# Altium footprint library CMR_ICs.PcbLib: 68 footprints (part 1 of 5)
Each footprint in its own frame and in the unit in brackets; x right, y up, seen from the top. Pads: shape width x height; smd on the part's side, far side on the other; paste and mask are expansions set on the pad; w line width, h text height; cw(c..) or ccw(c..) is an arc to the next point about the centre after c.
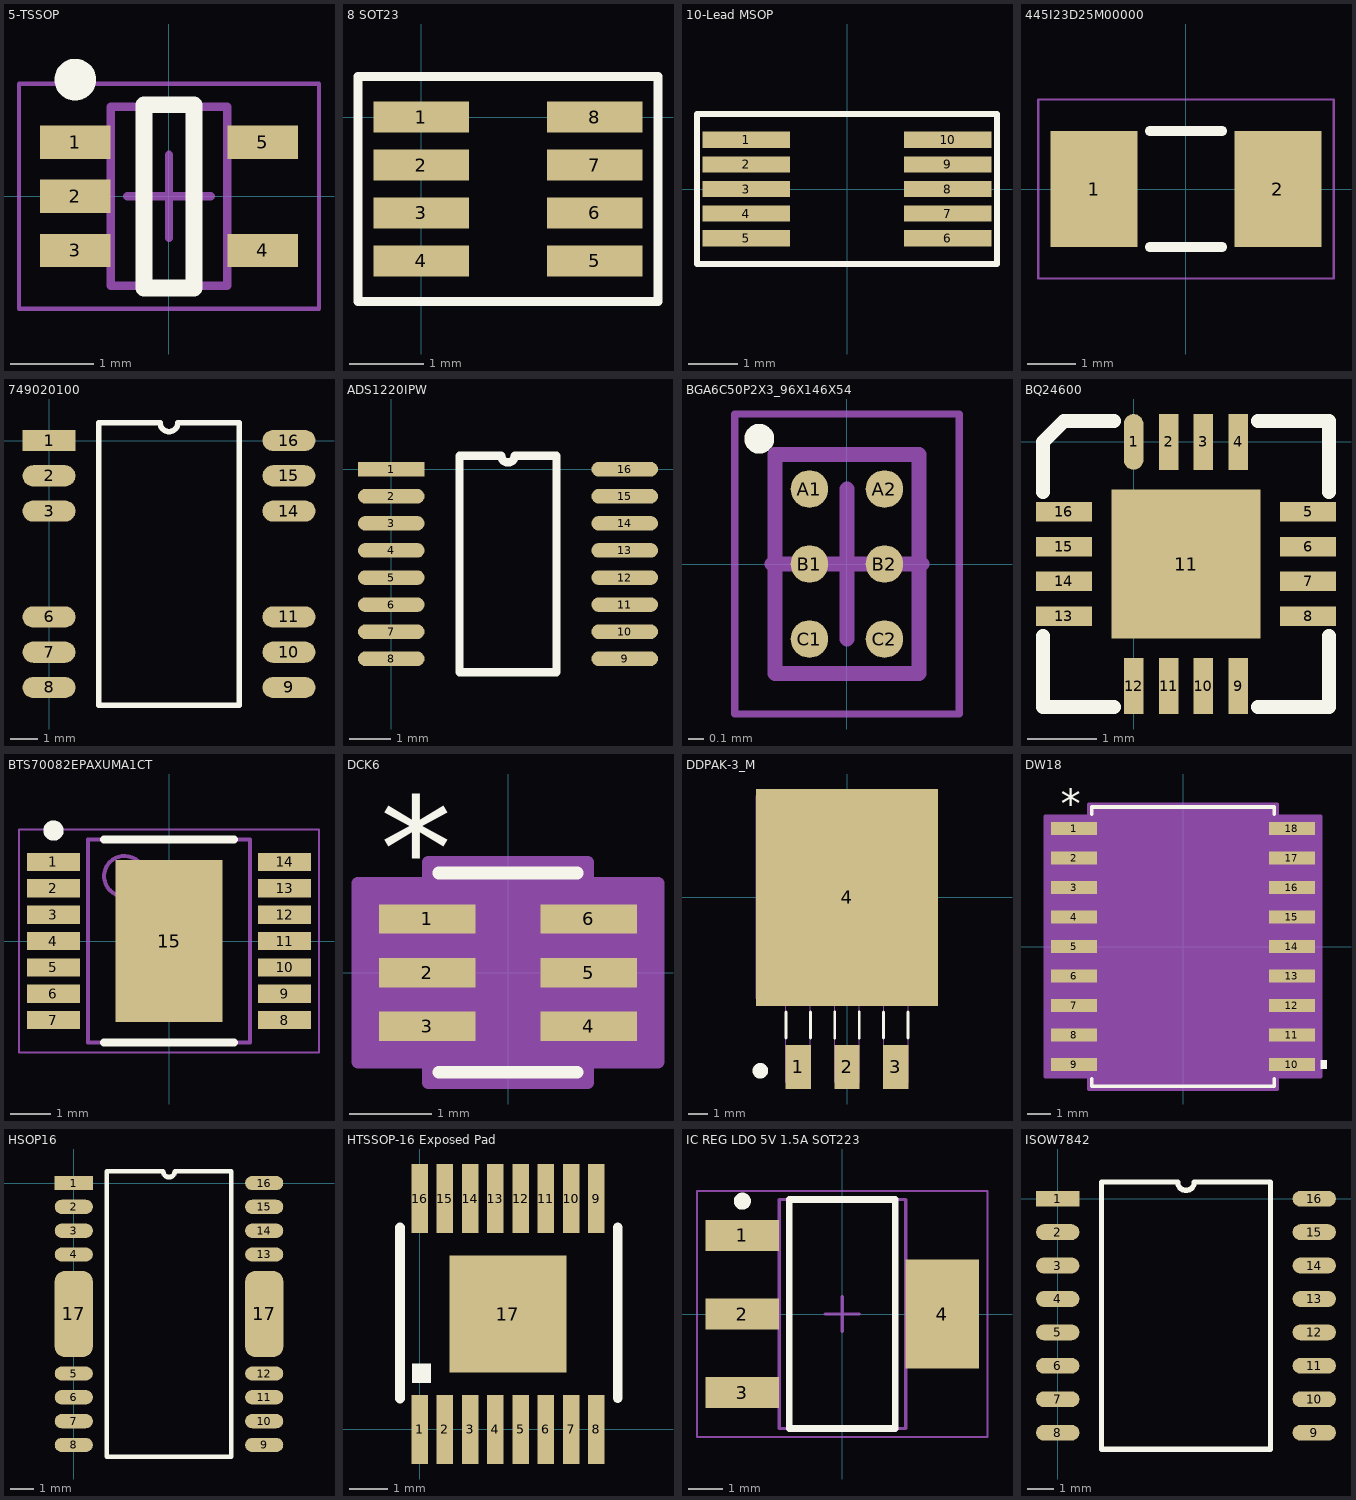
[diagram p0: the footprints below, top view; thin cyan lines are the x and y axes]

## 5-TSSOP [mm] "aka SC-70-5 or SOT-353"
height 1.1
pads (5):
  rect 0.85x0.4 smd: 1(-1.125,0.65) 2(-1.125,0) 3(-1.125,-0.65) 4(1.125,-0.65) 5(1.125,0.65)
Top Overlay:
  circle w0.25: c-1.125,1.4 r0.125
  lines w0.2: -0.3,-1.1 0.3,-1.1 0.3,1.1 -0.3,1.1 -0.3,-1.1
Mechanical 13:
  lines w0.1: -0.7,-1.075 -0.7,1.075 0.7,1.075 0.7,-1.075 -0.7,-1.075
Mechanical 15:
  lines w0.05: -1.8,-1.35 -1.8,1.35 1.8,1.35 1.8,-1.35 -1.8,-1.35
  lines w0.1: -0.5,0 0.5,0 ; 0,-0.5 0,0.5
3D body "5-TSSOP.step": height 1.1, standoff 0, extent -1.2,-1.075 1.2,1.075

## 8 SOT23 [mm] "used for MAX6749"
height 1.1
pads (8):
  rect 1.3x0.42 smd paste+0: 1(0,0) 2(0,-0.65) 3(0,-1.3) 4(0,-1.95) 5(2.35,-1.95) 6(2.35,-1.3) 7(2.35,-0.65) 8(2.35,0)
Top Overlay:
  lines w0.127: -0.857,-2.499 3.207,-2.499 3.207,0.549 -0.857,0.549 -0.857,-2.499
3D body "User Library-SOT23-8.step": height 1.11, standoff 0, extent -0.227,-2.475 2.577,0.525

## 10-Lead MSOP [mil] "used for AD5271BRMZ"
height 43.31
pads (10):
  rect 70x13 smd paste+0 mask+2: 1(-80.5,39.37) 2(-80.5,19.68) 3(-80.5,0) 4(-80.5,-19.68) 5(-80.5,-39.37) 6(80.5,-39.37) 7(80.5,-19.68) 8(80.5,0) 9(80.5,19.68) 10(80.5,39.37)
Top Overlay:
  lines w5: -120,-60 120,-60 120,60 -120,60 -120,-60
3D body "RM_10.stp": height 43.01, standoff 0, extent -102,-61.63 101,60.37
3D body: height 43.31, standoff 0, extent -102.37,-61.63 101.37,60.37

## 445I23D25M00000 [mm] "2-SMD 5x3.2"
pads (2):
  rect 1.8x2.4 smd: 1(-1.9,0) 2(1.9,0)
Top Overlay:
  lines w0.2: -0.75,-1.2 0.75,-1.2 ; -0.75,1.2 0.75,1.2
Mechanical 15:
  lines w0.05: -3.05,-1.85 3.05,-1.85 3.05,1.85 -3.05,1.85 -3.05,-1.85
3D body "User Library-445-CRYTAL-SMD.step": height 1.35, standoff 0, extent -2.5,-1.6 2.5,1.6

## 749020100 [mm] "10/100/1000 SMD LAN Transformer"
height 2.16
pads (12):
  rect 1.91x0.76 smd: 1(0,0)
  oval 1.91x0.76 smd: 2(0,-1.27) 3(0,-2.54) 6(0,-6.35) 7(0,-7.62) 8(0,-8.89) 9(8.635,-8.89) 10(8.635,-7.62) 11(8.635,-6.35) 14(8.635,-2.54) 15(8.635,-1.27) 16(8.635,0)
Top Overlay:
  lines w0.2: 1.79,-9.525 6.845,-9.525 6.845,0.635 4.635,0.635 cw(c4.317,0.635) 4,0.635 1.79,0.635 1.79,-9.525

## ADS1220IPW [mm]
pads (16):
  rect 1.6x0.35 smd mask+0.07: 1(0,0)
  oval 1.6x0.35 smd mask+0.07: 2(0,-0.65) 3(0,-1.3) 4(0,-1.95) 5(0,-2.6) 6(0,-3.25) 7(0,-3.9) 8(0,-4.55) 9(5.6,-4.55) 10(5.6,-3.9) 11(5.6,-3.25) 12(5.6,-2.6) 13(5.6,-1.95) 14(5.6,-1.3) 15(5.6,-0.65) 16(5.6,0)
Top Overlay:
  lines w0.2: 1.635,-4.875 1.635,0.325 2.638,0.325 ccw(c2.8,0.325) 2.962,0.325 3.965,0.325 3.965,-4.875 1.635,-4.875
3D body "PW0016A.stp": height 1.13, standoff 0, extent -0.406,-4.76 5.994,0.24

## BGA6C50P2X3_96X146X54 [mm] "BGA, 6-Leads, Body 0.96x1.46mmx0.54mm, Pitch 0.50mm"
height 0.54
pads (6):
  round 0.25 smd: A1(-0.25,0.5) A2(0.25,0.5) B1(-0.25,0) B2(0.25,0) C1(-0.25,-0.5) C2(0.25,-0.5)
Top Overlay:
  circle w0.1: c-0.585,0.835 r0.05
Mechanical 13:
  lines w0.1: -0.48,-0.73 0.48,-0.73 0.48,0.73 -0.48,0.73 -0.48,-0.73
Mechanical 15:
  lines w0.05: -0.75,-1 0.75,-1 0.75,1 -0.75,1 -0.75,-1
  lines w0.1: -0.5,0 0.5,0 ; 0,-0.5 0,0.5
3D body: height 0.54, standoff 0.23, extent -0.48,-0.73 0.48,0.73

## BQ24600 [mm]
height 1
pads (17):
  oval 0.28x0.8 smd: 1(0,0)
  rect 0.28x0.8 smd: 2(0.5,0) 3(1,0) 4(1.5,0) 9(1.5,-3.5) 10(1,-3.5) 11(0.5,-3.5) 12(0,-3.5)
  rect 0.8x0.28 smd: 5(2.5,-1) 6(2.5,-1.5) 7(2.5,-2) 8(2.5,-2.5) 13(-1,-2.5) 14(-1,-2) 15(-1,-1.5) 16(-1,-1)
  rect 2.14x2.14 smd: 11(0.75,-1.75)
Top Overlay:
  lines w0.2: -1.3,-2.78 -1.3,-3.8 -0.28,-3.8 ; -1.3,-0.72 -1.3,0 -1,0.3 -0.28,0.3 ; 1.78,-3.8 2.8,-3.8 2.8,-2.78 ; 1.78,0.3 2.8,0.3 2.8,-0.72
3D body: height 1, standoff 0, extent -1.05,-3.55 2.55,0.05

## BTS70082EPAXUMA1CT [mm] "TSOP, 14-Leads, Body 4.90x3.90mm, Pitch 0.65mm, Thermal Pad 4.00x2.65mm, IPC Medium Density"
height 0.95
pads (15):
  rect 1.31x0.45 smd: 1(-2.85,1.95) 2(-2.85,1.3) 3(-2.85,0.65) 4(-2.85,0) 5(-2.85,-0.65) 6(-2.85,-1.3) 7(-2.85,-1.95) 8(2.85,-1.95) 9(2.85,-1.3) 10(2.85,-0.65) 11(2.85,0) 12(2.85,0.65) 13(2.85,1.3) 14(2.85,1.95)
  rect 2.65x4 smd: 15(0,0)
Top Overlay:
  circle w0.25: c-2.85,2.725 r0.125
  lines w0.2: -1.6,-2.5 1.6,-2.5 ; -1.6,2.5 1.6,2.5
Mechanical 13:
  circle w0.1: c-1.1,1.6 r0.5
  lines w0.1: -2,-2.5 2,-2.5 2,2.5 -2,2.5 -2,-2.5
Mechanical 15:
  lines w0.05: -3.7,-2.75 3.7,-2.75 3.7,2.75 -3.7,2.75 -3.7,-2.75
  lines w0.1: -0.5,0 0.5,0 ; 0,-0.5 0,0.5
3D body: height 0.95, standoff 0, extent -2,-2.5 2,2.5

## DCK6 [mil]
pads (6):
  rect 46x14 smd paste+0 mask+0: 1(-38.5,25.59) 2(-38.5,0) 3(-38.5,-25.59) 4(38.5,-25.59) 5(38.5,0) 6(38.5,25.59)
Top Overlay:
  lines w6: -33,-47.5 33,-47.5 ; -33,47.5 33,47.5
  text "*" at -61,34.59 h50
Mechanical 13:
  lines w0: -12,42.5 ccw(c0,42.5) 12,42.5
  lines w1: -47.5,-31.59 -47.5,-19.59 -28,-19.59 -28,-31.59 -47.5,-31.59 ; -47.5,-6 -47.5,6 -28,6 -28,-6 -47.5,-6 ; -47.5,19.59 -47.5,31.59 -28,31.59 -28,19.59 -47.5,19.59 ; -28,-42.5 28,-42.5 28,42.5 -28,42.5 -28,-42.5 ; 28,-31.59 28,-19.59 47.5,-19.59 47.5,-31.59 28,-31.59 ; 28,-6 28,6 47.5,6 47.5,-6 28,-6 ; 28,19.59 28,31.59 47.5,31.59 47.5,19.59 28,19.59
  text "*" at -25.5,-10.5 h50
Mechanical 15:
  region: -38,-42.59 -71.5,-42.59 -71.5,42.59 -38,42.59 -38,52.5 38,52.5 38,42.59 71.5,42.59 71.5,-42.59 38,-42.59 38,-52.5 -38,-52.5
  lines w6: -71.5,-42.59 -71.5,42.59 -38,42.59 -38,52.5 38,52.5 38,42.59 71.5,42.59 71.5,-42.59 38,-42.59 38,-52.5 -38,-52.5 -38,-42.59 -71.5,-42.59
3D body: height 10, standoff 0, extent 0,0 10,10
3D body "DCK6.stp": height 42.61, standoff -0.5, extent -47.48,-42.51 47.49,42.52

## DDPAK-3_M [mil]
pads (4):
  rect 52x90 smd paste+0 mask+0: 1(-100,-346.5) 2(0,-346.5) 3(100,-346.5)
  rect 372x443 smd paste+0 mask+0: 4(0,0)
Top Overlay:
  circle w23.62: c-177.17,-354.33 r3.94
  lines w6: -125,-287.5 -125,-234.6 ; -75,-287.5 -75,-234.6 ; -25,-287.5 -25,-234.6 ; 25,-287.5 25,-234.6 ; 75,-287.5 75,-234.6 ; 125,-287.5 125,-234.6
Mechanical 13:
  lines w1: -185,-207.5 -185,207.5 185,207.5 185,-207.5 -185,-207.5 ; -125,-377.5 -75,-377.5 -75,-207.5 -125,-207.5 -125,-377.5 ; -25,-377.5 25,-377.5 25,-207.5 -25,-207.5 -25,-377.5 ; 75,-377.5 125,-377.5 125,-207.5 75,-207.5 75,-377.5
  text "*" at -112.5,-222.5 h50
3D body: height 10, standoff 0, extent 0,0 10,10
3D body "DDPAK-3_M.stp": height 184.06, standoff 1.93, extent -184.99,-350.43 185,172.17

## DW18 [mil]
pads (18):
  rect 78x22 smd paste+0 mask+0: 1(-184.5,200) 2(-184.5,150) 3(-184.5,100) 4(-184.5,50) 5(-184.5,0) 6(-184.5,-50) 7(-184.5,-100) 8(-184.5,-150) 9(-184.5,-200) 10(184.5,-200) 11(184.5,-150) 12(184.5,-100) 13(184.5,-50) 14(184.5,0) 15(184.5,50) 16(184.5,100) 17(184.5,150) 18(184.5,200)
Top Overlay:
  region: 233.5,-192.5 243.5,-192.5 243.5,-207.5 233.5,-207.5
  lines w6: -154.5,-224.1 -154.5,-236.5 154.5,-236.5 154.5,-224.1 ; -154.5,224.1 -154.5,236.5 154.5,236.5 154.5,224.1
  text "*" at -207,217 h50
Mechanical 13:
  lines w0: -12,231.5 ccw(c0,231.5) 12,231.5
  lines w1: -209.5,-210 -209.5,-190 -149.5,-190 -149.5,-210 -209.5,-210 ; -209.5,-160 -209.5,-140 -149.5,-140 -149.5,-160 -209.5,-160 ; -209.5,-110 -209.5,-90 -149.5,-90 -149.5,-110 -209.5,-110 ; -209.5,-60 -209.5,-40 -149.5,-40 -149.5,-60 -209.5,-60 ; -209.5,-10 -209.5,10 -149.5,10 -149.5,-10 -209.5,-10 ; -209.5,40 -209.5,60 -149.5,60 -149.5,40 -209.5,40 ; -209.5,90 -209.5,110 -149.5,110 -149.5,90 -209.5,90 ; -209.5,140 -209.5,160 -149.5,160 -149.5,140 -209.5,140 ; -209.5,190 -209.5,210 -149.5,210 -149.5,190 -209.5,190 ; -149.5,-231.5 149.5,-231.5 149.5,231.5 -149.5,231.5 -149.5,-231.5 ; 149.5,-210 149.5,-190 209.5,-190 209.5,-210 149.5,-210 ; 149.5,-160 149.5,-140 209.5,-140 209.5,-160 149.5,-160 ; 149.5,-110 149.5,-90 209.5,-90 209.5,-110 149.5,-110 ; 149.5,-60 149.5,-40 209.5,-40 209.5,-60 149.5,-60 ; 149.5,-10 149.5,10 209.5,10 209.5,-10 149.5,-10 ; 149.5,40 149.5,60 209.5,60 209.5,40 149.5,40 ; 149.5,90 149.5,110 209.5,110 209.5,90 149.5,90 ; 149.5,140 149.5,160 209.5,160 209.5,140 149.5,140 ; 149.5,190 149.5,210 209.5,210 209.5,190 149.5,190
  text "*" at -147,178.5 h50
Mechanical 15:
  region: -159.5,-221 -233.5,-221 -233.5,221 -159.5,221 -159.5,241.5 159.5,241.5 159.5,221 233.5,221 233.5,-221 159.5,-221 159.5,-241.5 -159.5,-241.5
  lines w6: -233.5,-221 -233.5,221 -159.5,221 -159.5,241.5 159.5,241.5 159.5,221 233.5,221 233.5,-221 159.5,-221 159.5,-241.5 -159.5,-241.5 -159.5,-221 -233.5,-221
3D body: height 10, standoff 0, extent 0,0 10,10

## HSOP16 [mm]
pads (18):
  rect 1.6x0.6 smd: 1(0,0)
  oval 1.6x0.6 smd: 2(0,-1) 3(0,-2) 4(0,-3) 5(0,-8) 6(0,-9) 7(0,-10) 8(0,-11) 9(8,-11) 10(8,-10) 11(8,-9) 12(8,-8) 13(8,-3) 14(8,-2) 15(8,-1) 16(8,0)
  rrect50% 1.6x3.6 smd: 17(0,-5.5) 17(8,-5.5)
Top Layer:
  region: 0,-4
  region: 8,-4
Top Overlay:
  lines w0.2: 1.385,-11.5 6.615,-11.5 6.615,0.5 4.25,0.5 cw(c4,0.5) 3.75,0.5 1.385,0.5 1.385,-11.5
3D body: height 2.85, standoff 0, extent 0,-12.3 8,1.2

## HTSSOP-16 Exposed Pad [mm]
pads (17):
  rect 0.42x1.78 smd: 1(0,0) 2(0.65,0) 3(1.3,0) 4(1.95,0) 5(2.6,0) 6(3.25,0) 7(3.9,0) 8(4.55,0) 9(4.55,5.94) 10(3.9,5.94) 11(3.25,5.94) 12(2.6,5.94) 13(1.95,5.94) 14(1.3,5.94) 15(0.65,5.94) 16(0,5.94)
  rect 3x3 smd: 17(2.275,2.97)
Top Overlay:
  rectangle: -0.2,1.2 0.3,1.7
  lines w0.254: -0.5,0.8 -0.5,5.194 ; 5.1,0.803 5.1,5.197
3D body "HTSSOP16.STEP": height 1.2, standoff 0, extent -0.203,0.772 4.797,5.172

## IC REG LDO 5V 1.5A SOT223 [mm] "Linear Voltage Regulator IC Positive Fixed 1 Output 5V 1.5A SOT-223-4"
height 1.8
pads (4):
  rect 2.15x0.9 smd: 1(-2.925,2.3) 2(-2.925,0) 3(-2.925,-2.3)
  rect 2.15x3.2 smd: 4(2.925,0)
Top Overlay:
  circle w0.25: c-2.925,3.3 r0.125
  lines w0.2: -1.55,-3.35 1.55,-3.35 1.55,3.35 -1.55,3.35 -1.55,-3.35
Mechanical 13:
  lines w0.1: -1.85,-3.35 1.85,-3.35 1.85,3.35 -1.85,3.35 -1.85,-3.35
Mechanical 15:
  lines w0.05: -4.25,-3.6 4.25,-3.6 4.25,3.6 -4.25,3.6 -4.25,-3.6
  lines w0.1: -0.5,0 0.5,0 ; 0,-0.5 0,0.5
3D body: height 1.8, standoff 0.02, extent -1.85,-3.35 1.85,3.35

## ISOW7842 [mm]
pads (16):
  rect 1.65x0.6 smd: 1(0,0)
  oval 1.65x0.6 smd: 2(0,-1.27) 3(0,-2.54) 4(0,-3.81) 5(0,-5.08) 6(0,-6.35) 7(0,-7.62) 8(0,-8.89) 9(9.75,-8.89) 10(9.75,-7.62) 11(9.75,-6.35) 12(9.75,-5.08) 13(9.75,-3.81) 14(9.75,-2.54) 15(9.75,-1.27) 16(9.75,0)
Top Overlay:
  lines w0.2: 1.66,-9.525 8.09,-9.525 8.09,0.635 5.192,0.635 cw(c4.875,0.635) 4.557,0.635 1.66,0.635 1.66,-9.525
3D body: height 2.65, standoff 0, extent 1.524,-9.652 8.255,0.762